# Altium footprint library Horizont_11_12_2017.PcbLib: 257 footprints (part 3 of 17)
Each footprint in its own frame and in the unit in brackets; x right, y up, seen from the top. Pads: shape width x height; smd on the part's side, far side on the other; paste and mask are expansions set on the pad; w line width, h text height; cw(c..) or ccw(c..) is an arc to the next point about the centre after c.
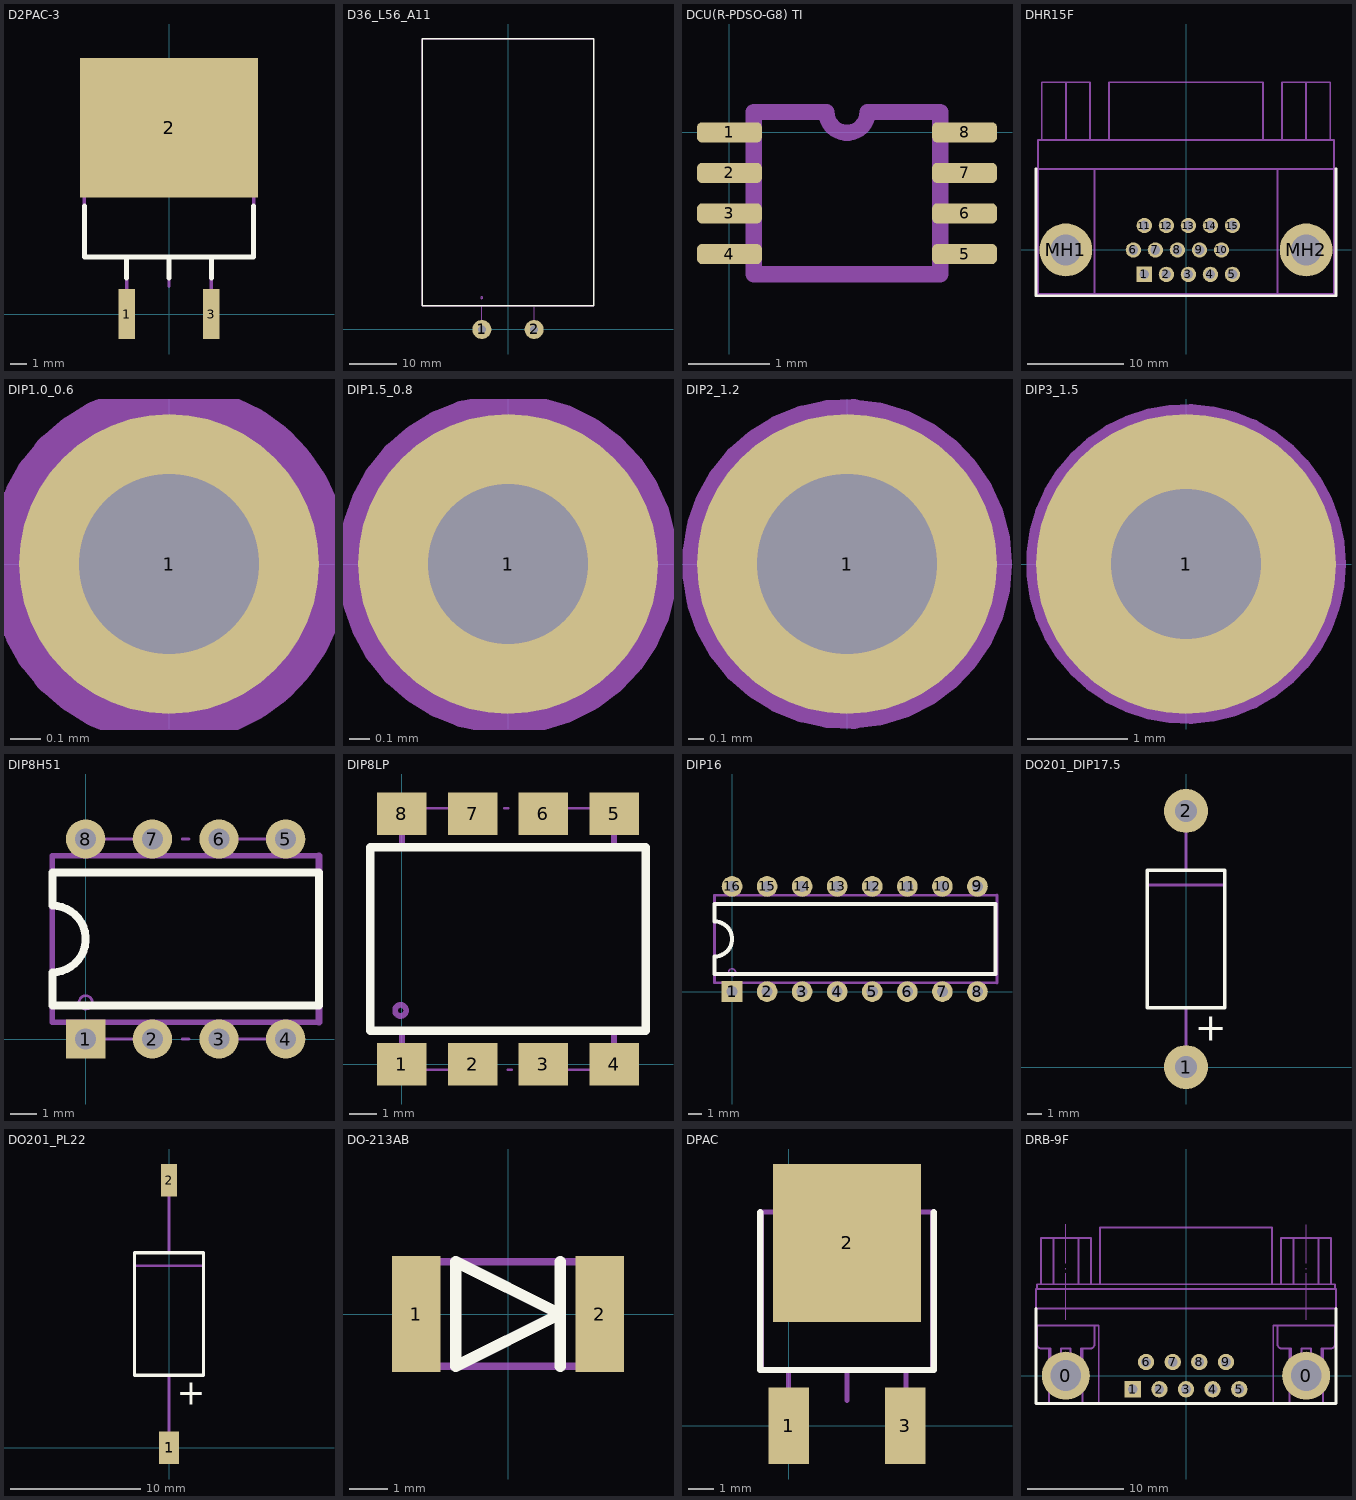
[diagram p2: the footprints below, top view; thin cyan lines are the x and y axes]

## D2PAC-3 [mm]
height 2.38
pads (3):
  rect 1x3 smd: 1(-2.54,0) 3(2.54,0)
  rect 10.66x8.38 smd: 2(0,11.176)
Top Overlay:
  lines w0.3: -5.08,6.477 -5.08,3.429 5.08,3.429 5.08,6.477 ; -2.54,2.159 -2.54,3.429 ; 0,2.159 0,3.429 ; 2.54,2.159 2.54,3.429
Mechanical 1:
  lines w0.2: -4.826,12.7 -4.826,13.081 -3.937,13.97 3.937,13.97 4.826,13.081 4.826,12.7 ; -2.54,-0.254 -2.54,3.429 ; 0,1.651 0,3.429 ; 2.54,-0.254 2.54,3.429 ; -5.08,3.429 -5.08,12.7 5.08,12.7 5.08,3.429 -5.08,3.429
  text ".Designator" at -3.048,8.255 h1.5
  text ".Comment" at -2.921,5.715 h1.5
  text "2" at -0.254,4.064 h1.5
  text "1" at -2.667,4.064 h1.5
  text "3" at 2.286,4.064 h1.5
3D body "D2PAC.STEP": height 4.5, standoff -0.01, extent -5.08,-0.508 5.08,13.869

## D36_L56_A11 [mm]
height 36
pads (2):
  round 4 hole 1.7: 1(-5.5,0) 2(5.5,0)
Top Overlay:
  lines w0.3: -18,5 -18,61.1 18,61.1 18,5 -18,5
Mechanical 1:
  circle w0.2: c-5.55,6.69 r0.2
  lines w0.2: -5.5,0 -5.5,5 ; 5.5,0 5.5,5 ; -18,5 -18,61.1 18,61.1 18,5 -18,5
  text ".Designator" at 0.2,31.1 h1.5
3D body "KG-450-470.stp": height 35.97, standoff 0.04, extent -18,0 17.873,61

## DCU(R-PDSO-G8) TI [mm]
pads (8):
  rrect50% 0.8x0.25 smd: 1(0,0) 2(0,-0.5) 3(0,-1) 4(0,-1.5) 5(2.9,-1.5) 6(2.9,-1) 7(2.9,-0.5) 8(2.9,0)
Mechanical 1:
  lines w0.2: 0.3,-1.75 2.6,-1.75 2.6,0.25 1.704,0.25 cw(c1.45,0.25) 1.196,0.25 0.3,0.25 0.3,-1.75
3D body "User Library-TI_DCU.STEP": height 0.9, standoff 0, extent -0.103,-1.75 3.004,0.25

## DHR15F [mm]
pads (17):
  rect 1.6x1.6 hole 1: 1(-4.33,-2.54)
  round 1.6 hole 1: 2(-2.04,-2.54) 3(0.25,-2.54) 4(2.54,-2.54) 5(4.83,-2.54) 6(-5.47,0) 7(-3.18,0) 8(-0.89,0) 9(1.4,0) 10(3.69,0) 11(-4.33,2.54) 12(-2.04,2.54) 13(0.25,2.54) 14(2.54,2.54) 15(4.83,2.54)
  round 5.5 hole 3.2: MH1(-12.5,0) MH2(12.5,0)
Top Overlay:
  lines w0.3: -15.6,8.44 -15.6,-4.76 15.6,-4.76 15.6,-4.56 15.6,8.44
Mechanical 1:
  lines w0.2: -15.4,8.44 15.4,8.44 ; -15,11.44 -15,17.44 -10,17.44 -10,11.44 ; -12.5,11.44 -12.5,17.44 ; -9.5,-4.56 -9.5,8.44 ; -8,11.44 -8,17.44 8,17.44 8,11.44 ; 9.5,-4.56 9.5,8.44 ; 10,11.44 10,17.44 15,17.44 15,11.44 ; 12.5,11.44 12.5,17.44 ; -15.4,-4.56 -15.4,11.44 15.4,11.44 15.4,-4.56 -15.4,-4.56
  text ".Designator" at -1.63,5.16 h1.5
  text "11" at -7.424,1.343 h2.12
  text "6" at -7.528,-1.157 h2.12
  text "10" at 5.076,-1.157 h2.12
  text "1" at -6.528,-3.657 h2.12
  text "15" at 6.076,1.343 h2.12
  text "5" at 6.472,-3.657 h2.12
3D body "DHR-15F.STEP": height 12.55, standoff -3.8, extent -15.45,-3.97 15.45,17.63

## DIP1.0_0.6 [mm]
pads (1):
  round 1 hole 0.6: 1(0,0)
Mechanical 1:
  circle w0.2: c0,0 r0.5
  text ".Designator" at -0.5,1 h1.5
Mechanical 2:
  circle w0.2: c0,0 r0.5

## DIP1.5_0.8 [mm]
pads (1):
  round 1.5 hole 0.8: 1(0,0)
Mechanical 1:
  circle w0.2: c0,0 r0.75
  text ".Designator" at -0.67,1.25 h1.5
Mechanical 2:
  circle w0.2: c0,0 r0.75

## DIP2_1.2 [mm]
pads (1):
  round 2 hole 1.2: 1(0,0)
Mechanical 1:
  circle w0.2: c0,0 r1
  text ".Designator" at -0.67,1.25 h1.5
Mechanical 2:
  circle w0.2: c0,0 r1

## DIP3_1.5 [mm]
pads (1):
  round 3 hole 1.5: 1(0,0)
Mechanical 1:
  circle w0.2: c0,0 r1.5
  text ".Designator" at -0.92,2 h1.5
Mechanical 2:
  circle w0.2: c0,0 r1.5

## DIP8H51 [mm]
height 5.1
pads (8):
  rect 1.5x1.5 hole 0.8: 1(0,0)
  round 1.5 hole 0.8: 2(2.54,0) 3(5.08,0) 4(7.62,0) 5(7.62,7.62) 6(5.08,7.62) 7(2.54,7.62) 8(0,7.62)
Top Overlay:
  lines w0.3: -1.27,1.27 -1.27,2.54 ccw(c-1.27,3.81) -1.27,5.08 -1.27,6.35 8.89,6.35 8.89,1.27 -1.27,1.27
Mechanical 1:
  circle w0.1: c0,1.397 r0.254
  lines w0.025: -1.27,2.54 ccw(c-1.27,3.81) -1.27,5.08
  lines w0.1: 0,0 2.54,0 ; 0,7.62 2.54,7.62 ; 3.683,0 3.937,0 ; 3.683,7.62 3.937,7.62 ; 5.08,0 7.62,0 ; 5.08,7.62 7.62,7.62
  lines w0.2: 0,0 0,0.635 ; 0,6.985 0,7.62 ; 7.62,0 7.62,0.635 ; 7.62,6.985 7.62,7.62 ; 8.89,0.635 -1.27,0.635 -1.27,6.985 8.89,6.985
  lines w0.25: 8.89,0.635 8.89,6.985
  text ".Designator" at 2.76,4.32 h1.5
  text ".Comment" at 1.17,2.62 h1.5
  text "8" at -0.19,5.64 h1.5
3D body "DIP8h51.stp": height 5.12, standoff -3, extent -1.325,-0.15 8.975,7.74

## DIP8LP [mm]
height 5
pads (8):
  rect 1.78x1.52 smd: 1(0,0) 2(2.54,0) 3(5.08,0) 4(7.62,0) 5(7.62,9) 6(5.08,9) 7(2.54,9) 8(0,9)
Top Overlay:
  lines w0.3: -1.14,1.2 8.76,1.2 8.76,7.8 -1.14,7.8 -1.14,1.2
Mechanical 1:
  circle w0.2: c-0.05,1.932 r0.2
  lines w0.1: 0,-0.199 3.175,-0.199 ; 0,9.199 3.175,9.199 ; 3.683,9.199 3.81,9.199 ; 3.81,-0.199 3.937,-0.199 ; 4.445,-0.199 7.62,-0.199 ; 4.445,9.199 7.62,9.199
  lines w0.2: 0,-0.199 0,1.198 ; 0,7.802 0,9.199 ; 7.62,-0.199 7.62,1.198 ; 7.62,7.802 7.62,9.199 ; -1.14,1.2 8.76,1.2 8.76,7.8 -1.14,7.8 -1.14,1.2
  text ".Designator" at 3.1,5.238 h1.5
  text ".Comment" at 1.51,3.538 h1.5
  text "8" at -0.27,6.483 h1.5
3D body "HCPL7800A-300.stp": height 4.96, standoff 0, extent -1.14,-0.452 8.76,9.448

## DIP16 [mm]
height 5.1
pads (16):
  rect 1.5x1.5 hole 0.8: 1(0,0)
  round 1.5 hole 0.8: 2(2.54,0) 3(5.08,0) 4(7.62,0) 5(10.16,0) 6(12.7,0) 7(15.24,0) 8(17.78,0) 9(17.78,7.62) 10(15.24,7.62) 11(12.7,7.62) 12(10.16,7.62) 13(7.62,7.62) 14(5.08,7.62) 15(2.54,7.62) 16(0,7.62)
Top Overlay:
  lines w0.3: -1.27,1.27 19.1,1.27 19.1,6.35 -1.27,6.35 -1.27,5.08 cw(c-1.27,3.81) -1.27,2.54 -1.27,1.27
Mechanical 1:
  circle w0.1: c0,1.397 r0.254
  lines w0.025: -1.27,2.54 ccw(c-1.27,3.81) -1.27,5.08
  lines w0.2: 19.2,0.635 -1.27,0.635 -1.27,6.985 19.2,6.985
  lines w0.25: 19.2,0.635 19.2,6.985
  text "16" at -0.19,5.64 h1.5
  text ".Comment" at 1.17,2.62 h1.5
  text ".Designator" at 2.76,4.32 h1.5
3D body "SW3DPS-DIP 16 IC-DEFAULT.STEP": height 6.1, standoff -2.3, extent -1.3,-0.135 18.7,7.735

## DO201_DIP17.5 [mm]
height 5.3
pads (2):
  round 3 hole 1.5: 1(0,0) 2(0,17.5)
Top Overlay:
  lines w0.25: -2.65,4.05 2.65,4.05 2.65,13.45 -2.65,13.45 -2.65,4.05
  text "+" at 0.6,1.8 h1.93
Mechanical 1:
  lines w0.2: -2.65,12.45 2.65,12.45 ; 0,0 0,4.05 ; 0,13.45 0,17.5 ; -2.65,4.05 2.65,4.05 2.65,13.45 -2.65,13.45 -2.65,4.05
  text "+" at -0.3,4.5 h1.5
  text ".Designator" at 0.44,6.19 h1.5
3D body "1_5KE_DIP.stp": height 5.3, standoff -3, extent -2.65,-0.399 2.65,17.899

## DO201_PL22 [mm]
height 5.3
pads (2):
  rect 1.5x2.5 smd: 1(0,0)
  rect 1.2x2.5 smd: 2(0,20.5)
Top Overlay:
  lines w0.25: -2.65,5.55 2.65,5.55 2.65,14.95 -2.65,14.95 -2.65,5.55
  text "+" at 0.6,3.3 h1.93
Mechanical 1:
  lines w0.2: -2.65,13.95 2.65,13.95 ; 0,-0.8 0,5.55 ; 0,14.95 0,21.3 ; -2.65,5.55 2.65,5.55 2.65,14.95 -2.65,14.95 -2.65,5.55
  text "+" at -0.3,6 h1.5
  text ".Designator" at 0.44,7.69 h1.5
3D body "1_5KE_PL.stp": height 5.3, standoff 0, extent -2.65,-0.75 2.65,21.25

## DO-213AB [mm]
height 2.67
pads (2):
  rect 1.25x3 smd: 1(-2.375,0) 2(2.375,0)
Top Overlay:
  lines w0.3: 1.35,-1.35 1.35,1.35 ; -1.35,-1.35 1.35,0 -1.35,1.35 -1.35,-1.35
Mechanical 1:
  lines w0.2: -2.6,-1.35 2.55,-1.35 2.55,1.35 -2.6,1.35 -2.6,-1.35
  text "+" at -2.1,-0.45 h1.5
  text ".Designator" at -0.8,-0.35 h1.5
3D body "DO-213AB.stp": height 2.64, standoff -0.03, extent -2.6,-1.332 2.6,1.332

## DPAC [mm]
height 2.38
pads (3):
  rect 1.6x3 smd: 1(0,0) 3(4.58,0)
  rect 5.8x6.2 smd: 2(2.29,7.18)
Top Overlay:
  lines w0.25: -1.11,8.39 -1.11,2.19 5.69,2.19 5.69,8.39
Mechanical 1:
  lines w0.2: -0.41,8.4 -0.41,9.69 4.99,9.69 4.99,8.4 ; 0,-1 0,2.2 4.6,2.2 4.6,-1 ; 2.29,0.99 2.29,2.2 ; -1.06,2.2 -1.06,8.4 5.64,8.4 5.64,2.2 -1.06,2.2
  text "3" at 4.29,2.69 h1.5
  text "1" at -0.21,2.69 h1.5
  text "2" at 1.99,2.69 h1.5
  text ".Designator" at 0.749,5.949 h1.5
3D body "DPAC.stp": height 2.38, standoff 0, extent -1.1,-0.7 5.63,9.68

## DRB-9F [mm]
height 12.55
pads (11):
  round 5 hole 3.2: 0(-12.5,0) 0(12.5,0)
  rect 1.7x1.7 hole 1: 1(-5.54,-1.42)
  round 1.7 hole 1: 2(-2.77,-1.42) 3(0,-1.42) 4(2.77,-1.42) 5(5.54,-1.42) 6(-4.155,1.42) 7(-1.385,1.42) 8(1.385,1.42) 9(4.155,1.42)
Top Overlay:
  lines w0.3: -15.6,7 -15.6,-2.9 15.6,-2.9 15.6,7
Mechanical 1:
  lines w0.1: -12.5,5.82 -12.5,10.655 ; -12.5,11.085 -12.5,11.18 ; -12.5,11.695 -12.5,15.72 ; 12.5,5.81 12.5,10.645 ; 12.5,11.075 12.5,11.17 ; 12.5,11.685 12.5,15.71
  lines w0.2: -15.5,5.2 -15.5,3.3 ccw(c-15,3.3) -15,2.8 -14.1,2.8 -14.1,0.1 ; -15.49,9 -15.49,9.5 -14.59,9.5 14.59,9.5 15.49,9.5 15.49,9 ; -15.098,9.5 -15.098,14.3 -13.799,14.3 ; -14.25,-0.15 ccw(c-12.5,-0.15) -10.75,-0.15 ; -14.25,0.1 -14.1,0.1 ; -14.25,1.85 cw(c-12.5,1.85) -14.1,2.559 ; -14.25,2.8 -14.25,-2.9 ; -14.232,-0.4 -14.1,-0.4 ; -13.799,9.5 -13.799,14.3 ; -11.201,9.5 -11.201,14.3 ; -10.9,2.559 cw(c-12.5,1.85) -10.75,1.85 ; -10.768,-0.4 -10.9,-0.4 ; -10.75,0.1 -10.9,0.1 ; -10.75,2.8 -10.75,-2.9 ; -9.902,9.5 -9.902,14.3 -11.201,14.3 ; -9.5,5.2 -9.5,3.3 cw(c-10,3.3) -10,2.8 -10.9,2.8 -10.9,0.1 ; -8.96,9.5 -8.96,15.4 -6.68,15.4 6.68,15.4 8.96,15.4 8.96,9.5 ; 9.5,5.2 9.5,3.3 ccw(c10,3.3) 10,2.8 10.9,2.8 10.9,0.1 ; 9.902,9.5 9.902,14.3 11.201,14.3 ; 10.75,-0.15 ccw(c12.5,-0.15) 14.25,-0.15 ; 10.75,0.1 10.9,0.1 ; 10.75,1.85 cw(c12.5,1.85) 10.9,2.559 ; 10.75,2.8 10.75,-2.9 ; 10.768,-0.4 10.9,-0.4 ; 11.201,9.5 11.201,14.3 ; 13.799,9.5 13.799,14.3 ; 14.1,2.559 cw(c12.5,1.85) 14.25,1.85 ; 14.232,-0.4 14.1,-0.4 ; 14.25,0.1 14.1,0.1 ; 14.25,2.8 14.25,-2.9 ; 15.098,9.5 15.098,14.3 13.799,14.3 ; 15.5,5.2 15.5,3.3 cw(c15,3.3) 15,2.8 14.1,2.8 14.1,0.1 ; -15.59,5.2 -15.59,-2.9 -14.25,-2.9 ; -15.59,5.2 -15.59,7 ; -15.59,5.2 -9.07,5.2 -9.07,-2.9 ; -15.59,7 -15.59,9 -14.59,9 14.59,9 15.59,9 15.59,7 ; -15.59,7 -14.59,7 14.59,7 15.59,7 ; -14.25,-2.9 -10.75,-2.9 ; -14.1,-0.4 -14.1,0.1 ; -14.1,-0.4 -13,-0.4 -13,0.1 -13,2.8 -12,2.8 -12,0.1 -12,-0.4 -10.9,-0.4 ; -13.799,14.3 -11.201,14.3 ; -10.9,-0.4 -10.9,0.1 ; -10.75,-2.9 -9.07,-2.9 ; -9.07,-2.9 -8.07,-2.9 8.07,-2.9 9.07,-2.9 ; 9.07,-2.9 10.75,-2.9 ; 9.07,-2.9 9.07,5.2 15.59,5.2 ; 10.75,-2.9 14.25,-2.9 ; 10.9,-0.4 10.9,0.1 ; 10.9,-0.4 12,-0.4 12,0.1 12,2.8 13,2.8 13,0.1 13,-0.4 14.1,-0.4 ; 11.201,14.3 13.799,14.3 ; 14.1,-0.4 14.1,0.1 ; 14.25,-2.9 15.59,-2.9 15.59,5.2 ; 15.59,5.2 15.59,7
  text "9" at 7.453,0.843 h1.5
  text "6" at -7.527,0.888 h1.5
  text "5" at 7.453,-1.907 h1.5
  text "1" at -8.2,-1.9 h1.5
  text ".Designator" at -2.34,4.33 h1.5
Mechanical 2:
  lines w0.1: -12.5,5.82 -12.5,10.655 ; -12.5,11.085 -12.5,11.18 ; -12.5,11.695 -12.5,15.72 ; 12.5,5.81 12.5,10.645 ; 12.5,11.075 12.5,11.17 ; 12.5,11.685 12.5,15.71
  lines w0.2: -15.098,9.5 -15.098,14.3 -13.799,14.3 ; -14.097,0.1 cw(c-12.5,0) -10.903,0.1 ; -14.052,-0.388 ccw(c-12.5,0) -10.948,-0.388 ; -13.799,9.5 -13.799,14.3 ; -11.201,9.5 -11.201,14.3 ; -9.902,9.5 -9.902,14.3 -11.201,14.3 ; -8.96,9.5 -8.96,15.4 -8.925,15.4 -8.079,15.4 -5.834,15.4 5.834,15.4 8.079,15.4 8.925,15.4 8.96,15.4 8.96,9.5 ; 9.902,9.5 9.902,14.3 11.201,14.3 ; 10.903,0.1 cw(c12.5,0) 14.097,0.1 ; 10.948,-0.388 ccw(c12.5,0) 14.052,-0.388 ; 11.201,9.5 11.201,14.3 ; 13.799,9.5 13.799,14.3 ; 15.098,9.5 15.098,14.3 13.799,14.3 ; -13.799,14.3 -11.201,14.3 ; 11.201,14.3 13.799,14.3 ; -15.49,9 -15.49,9.5 -14.5,9.5 14.5,9.5 15.49,9.5 15.49,9 -15.49,9 ; -14.5,-0.4 -14.5,0.1 -13.25,0.1 -13,0.1 -13,-0.4 -13.25,-0.4 -14.5,-0.4 ; -12,-0.4 -11.75,-0.4 -10.5,-0.4 -10.5,0.1 -11.75,0.1 -12,0.1 -12,-0.4 ; 10.5,-0.4 11.75,-0.4 12,-0.4 12,0.1 11.75,0.1 10.5,0.1 10.5,-0.4 ; 13,-0.4 13,0.1 13.25,0.1 14.5,0.1 14.5,-0.4 13.25,-0.4 13,-0.4
3D body "DRB-9F.stp": height 12.55, standoff -4, extent -15.59,-2.9 15.59,15.4